# Altium footprint library 我的器件.PCBLIB: 450 footprints (part 5 of 29)
Each footprint in its own frame and in the unit in brackets; x right, y up, seen from the top. Pads: shape width x height; smd on the part's side, far side on the other; paste and mask are expansions set on the pad; w line width, h text height; cw(c..) or ccw(c..) is an arc to the next point about the centre after c.
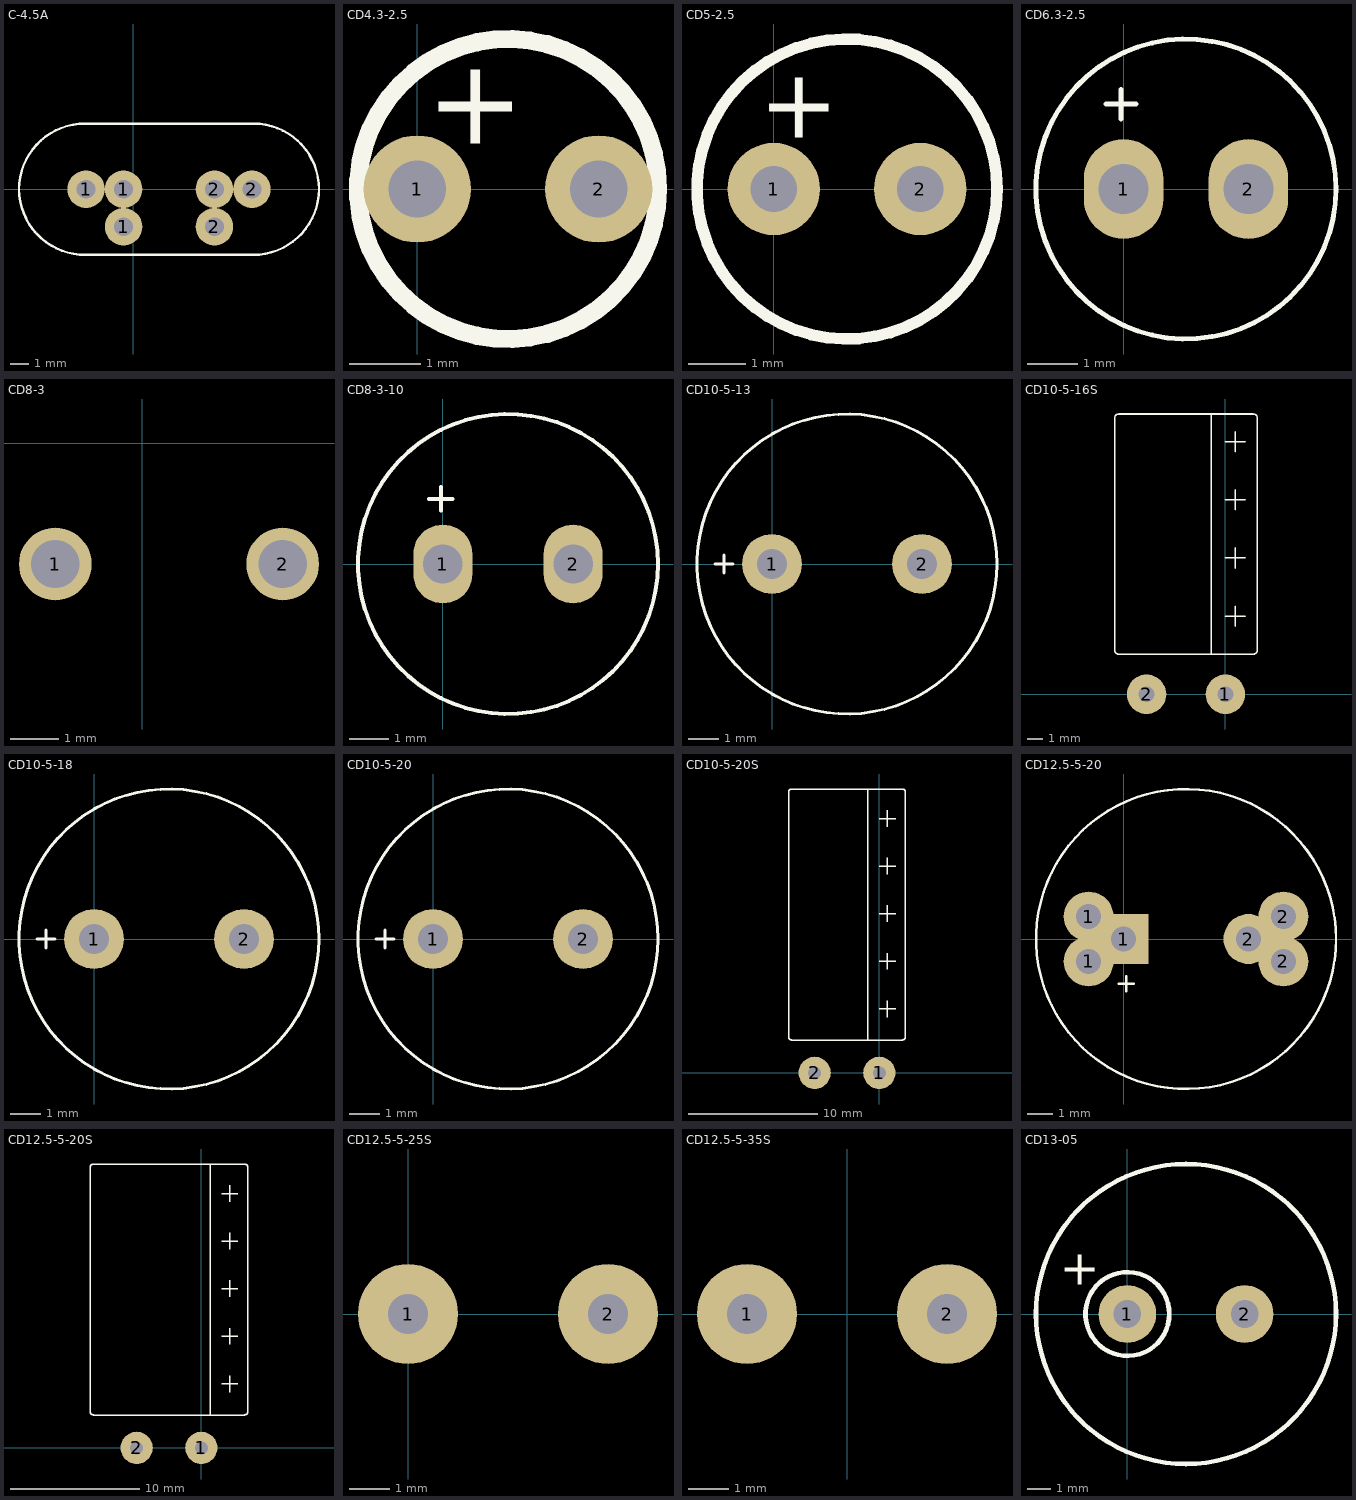
[diagram p4: the footprints below, top view; thin cyan lines are the x and y axes]

## C-4.5A [mm]
pads (6):
  round 2 hole 1: 1(-2.508,0) 1(-0.508,-2) 1(-0.508,0) 2(4.342,-2) 2(4.342,0) 2(6.342,0)
Top Overlay:
  lines w0.127: -6.083,0 cw(c-2.568,-0.015) -2.553,3.5 6.438,3.5 cw(c6.428,0.011) 9.917,0 cw(c6.415,0.002) 6.413,-3.5 -2.528,-3.5 cw(c-2.556,0.027) -6.083,0

## CD4.3-2.5 [mm] "Body 4.0mmX5.0mm"
height 5
pads (2):
  round 1.5 hole 0.8: 1(0,0) 2(2.54,0)
Top Overlay:
  circle w0.254: c1.27,0 r2.1
  text "+" at 0.127,0.635 h1.2

## CD5-2.5 [mm] "Body 5.0mmX12mm"
height 12
pads (2):
  round 1.6 hole 0.8: 1(0,0) 2(2.54,0)
Top Overlay:
  circle w0.2: c1.27,0 r2.6
  text "+" at -0.254,0.889 h1.2

## CD6.3-2.5 [mm] "Body 6.3mmX12mm"
height 12
pads (2):
  oval 1.6x2 hole 1: 1(0,0) 2(2.5,0)
Top Overlay:
  circle w0.1: c1.25,0 r3.008
  lines w0.1: -0.35,1.7 0.25,1.7 ; -0.05,1.4 -0.05,2
3D body: height 1, standoff -2, extent -0.4,-0.399 0.397,0.399
3D body: height 1, standoff -2, extent 2.1,-0.399 2.897,0.399
3D body: height 12.11, standoff 12.1, extent -1.05,-2.295 3.532,2.295
3D body: height 0.1, standoff 0, extent -0.75,-1.996 3.234,1.996
3D body: height 12.1, standoff 0.1, extent -1.95,-3.194 4.425,3.194

## CD8-3 [mm]
pads (2):
  round 1.5 hole 1: 1(-1.8,-2.5) 2(2.9,-2.5)
3D body: height 6.65, standoff -2, extent -2.197,-2.924 -1.401,-2.126
3D body: height 9.9, standoff 3.1, extent -3.399,-0.9 3.399,5.1
3D body: height 9.5, standoff 3.5, extent -2.999,9.4 2.999,11.4
3D body: height 10.49, standoff 2.5, extent -3.998,-0.7 3.998,11.3
3D body: height 6.65, standoff 5.85, extent -2.2,-2.525 -1.402,-0.725
3D body: height 6.65, standoff -2, extent 2.503,-2.899 3.3,-2.101
3D body: height 6.65, standoff 5.85, extent 1.345,-2.782 3.182,-0.945
3D body: height 6.65, standoff 5.85, extent 1.301,-1.5 2.099,0.3

## CD8-3-10 [mm]
pads (2):
  oval 1.5x2 hole 1: 1(0,0) 2(3.3,0)
Top Overlay:
  circle w0.1: c1.65,0 r3.8
  lines w0.1: -0.35,1.65 0.25,1.65 ; -0.05,1.35 -0.05,1.95
3D body: height 11.01, standoff 11, extent -1.347,-2.999 4.65,2.999
3D body: height 11, standoff 0.5, extent -2.45,-4.095 5.75,4.095
3D body: height 1, standoff -2, extent 2.903,-0.399 3.7,0.399
3D body: height 1, standoff -2, extent -0.397,-0.399 0.4,0.399
3D body: height 0.5, standoff 0.49, extent -1.822,-3.493 5.15,3.493
3D body: height 0.5, standoff 0, extent -1.64,-3.525 4.95,-1.25
3D body: height 0.5, standoff 0, extent -1.64,1.25 4.95,3.525

## CD10-5-13 [mm]
pads (2):
  round 2 hole 1: 1(0,0) 2(5,0)
Top Overlay:
  circle w0.1: c2.5,0 r5
  lines w0.1: -1.9,0 -1.3,0 ; -1.6,-0.3 -1.6,0.3
3D body: height 13.01, standoff 13, extent -0.996,-3.499 6,3.499
3D body: height 13, standoff 0.5, extent -2.594,-5.098 7.6,5.099
3D body: height 1, standoff -2, extent 4.603,-0.399 5.4,0.399
3D body: height 1, standoff -2, extent -0.397,-0.399 0.4,0.399
3D body: height 0.5, standoff 0.49, extent -0.972,-3.493 6,3.493
3D body: height 0.5, standoff 0, extent -0.79,-3.525 5.8,-1.25
3D body: height 0.5, standoff 0, extent -0.79,1.25 5.8,3.525

## CD10-5-16S [mm]
pads (2):
  round 2.5 hole 1: 1(0,0) 2(-5,0)
Top Overlay:
  lines w0.1: -0.9,2.54 -0.9,17.754 ; -0.011,4.953 1.259,4.953 ; -0.011,8.636 1.259,8.636 ; -0.011,12.319 1.259,12.319 ; -0.011,16.002 1.259,16.002 ; 0.624,4.318 0.624,5.588 ; 0.624,8.001 0.624,9.271 ; 0.624,11.684 0.624,12.954 ; 0.624,15.367 0.624,16.637 ; -7.021,2.794 ccw(c-6.767,2.794) -6.767,2.54 1.767,2.54 ccw(c1.767,2.794) 2.021,2.794 2.021,17.5 ccw(c1.767,17.5) 1.767,17.754 -6.767,17.754 ccw(c-6.767,17.5) -7.021,17.5 -7.021,2.794
3D body: height 6.65, standoff 5.85, extent -0.4,0.075 0.399,1.875
3D body: height 6.65, standoff -2, extent -0.398,-0.399 0.399,0.399
3D body: height 6.65, standoff 5.85, extent -5.4,0.075 -4.602,1.875
3D body: height 10.36, standoff 0, extent -7.69,2.21 2.69,18.21
3D body: height 8.67, standoff 1.7, extent -5.993,16.225 0.993,18.225
3D body: height 9.17, standoff 1.2, extent -6.49,1.725 1.494,7.725
3D body: height 6.65, standoff -2, extent -5.398,-0.399 -4.601,0.399

## CD10-5-18 [mm] "Body 10mmX18mm Distence 5mm"
pads (2):
  round 2 hole 1: 1(0,0) 2(5,0)
Top Overlay:
  circle w0.1: c2.5,0 r5
  lines w0.1: -1.9,0 -1.3,0 ; -1.6,-0.3 -1.6,0.3
3D body: height 1, standoff -2, extent -0.397,-0.399 0.4,0.399
3D body: height 1, standoff -2, extent 4.603,-0.399 5.4,0.399
3D body: height 18, standoff 0, extent -2.56,-5.09 7.6,5.09
3D body: height 18.01, standoff -0.01, extent -0.972,-3.493 6,3.493

## CD10-5-20 [mm]
pads (2):
  round 2 hole 1: 1(0,0) 2(5,0)
Top Overlay:
  circle w0.1: c2.5,0 r5
  lines w0.1: -1.9,0 -1.3,0 ; -1.6,-0.3 -1.6,0.3
3D body: height 21.01, standoff 21, extent -0.972,-3.493 6,3.493
3D body: height 21, standoff 0.5, extent -2.56,-5.09 7.6,5.09
3D body: height 1, standoff -2, extent 4.603,-0.399 5.4,0.399
3D body: height 1, standoff -2, extent -0.397,-0.399 0.4,0.399
3D body: height 0.5, standoff 0.49, extent -0.972,-3.493 6,3.493
3D body: height 0.5, standoff 0, extent -0.79,-3.525 5.8,-1.25
3D body: height 0.5, standoff 0, extent -0.79,1.25 5.8,3.525

## CD10-5-20S [mm]
pads (2):
  round 2.5 hole 1: 1(0,0) 2(-5,0)
Top Overlay:
  lines w0.1: -0.9,2.54 -0.9,21.971 ; -0.011,4.953 1.259,4.953 ; -0.011,8.636 1.259,8.636 ; -0.011,12.319 1.259,12.319 ; -0.011,16.002 1.259,16.002 ; -0.011,19.685 1.259,19.685 ; 0.624,4.318 0.624,5.588 ; 0.624,8.001 0.624,9.271 ; 0.624,11.684 0.624,12.954 ; 0.624,15.367 0.624,16.637 ; 0.624,19.05 0.624,20.32 ; -7.021,2.794 ccw(c-6.767,2.794) -6.767,2.54 1.767,2.54 ccw(c1.767,2.794) 2.021,2.794 2.021,21.717 ccw(c1.767,21.717) 1.767,21.971 -6.767,21.971 ccw(c-6.767,21.717) -7.021,21.717 -7.021,2.794
3D body: height 6.65, standoff -2, extent -5.398,-0.399 -4.601,0.399
3D body: height 9.17, standoff 1.2, extent -6.49,1.725 1.494,7.725
3D body: height 8.67, standoff 1.7, extent -5.993,20.225 0.993,22.225
3D body: height 10.36, standoff 0, extent -7.69,2.21 2.69,22.21
3D body: height 6.65, standoff 5.85, extent -5.4,0.075 -4.602,1.875
3D body: height 6.65, standoff -2, extent -0.398,-0.399 0.399,0.399
3D body: height 6.65, standoff 5.85, extent -0.4,0.075 0.399,1.875

## CD12.5-5-20 [mm]
pads (6):
  round 2 hole 1: 1(-1.4,-0.9) 1(-1.4,0.9) 2(5,0) 2(6.4,-0.9) 2(6.4,0.9)
  rect 2x2 hole 1: 1(0,0)
Top Overlay:
  circle w0.1: c2.5,0 r6.007
  lines w0.1: -0.2,-1.8 0.4,-1.8 ; 0.1,-2.1 0.1,-1.5
3D body: height 0.5, standoff 0, extent -1.4,1 6.375,4
3D body: height 0.5, standoff 0, extent -1.375,-4 6.4,-1
3D body: height 0.5, standoff 0.49, extent -1.492,-3.968 6.492,4
3D body: height 1, standoff -2, extent 4.603,-0.399 5.4,0.399
3D body: height 1, standoff -2, extent -0.397,-0.399 0.4,0.399
3D body: height 21.01, standoff 21, extent -1.468,-3.992 6.5,3.992
3D body: height 21, standoff 0.5, extent -3.8,-6.337 8.85,6.338

## CD12.5-5-20S [mm]
pads (2):
  round 2.5 hole 1: 1(0,0) 2(-5,0)
Top Overlay:
  lines w0.1: 0.675,2.54 0.675,21.971 ; 1.564,4.953 2.834,4.953 ; 1.564,8.636 2.834,8.636 ; 1.564,12.319 2.834,12.319 ; 1.564,16.002 2.834,16.002 ; 1.564,19.685 2.834,19.685 ; 2.199,4.318 2.199,5.588 ; 2.199,8.001 2.199,9.271 ; 2.199,11.684 2.199,12.954 ; 2.199,15.367 2.199,16.637 ; 2.199,19.05 2.199,20.32 ; -8.596,2.794 ccw(c-8.342,2.794) -8.342,2.54 3.342,2.54 ccw(c3.342,2.794) 3.596,2.794 3.596,21.717 ccw(c3.342,21.717) 3.342,21.971 -8.342,21.971 ccw(c-8.342,21.717) -8.596,21.717 -8.596,2.794
3D body: height 6.65, standoff -2, extent -5.398,-0.399 -4.601,0.399
3D body: height 10.37, standoff 2.4, extent -6.49,1.725 1.494,7.725
3D body: height 10.37, standoff 2.4, extent -6.492,20.225 1.492,22.225
3D body: height 12.75, standoff 0, extent -8.887,2.21 3.887,22.21
3D body: height 6.65, standoff 5.85, extent -5.4,0.075 -4.602,1.875
3D body: height 6.65, standoff -2, extent -0.398,-0.399 0.399,0.399
3D body: height 6.65, standoff 5.85, extent -0.4,0.075 0.399,1.875

## CD12.5-5-25S [mm]
pads (2):
  round 2.5 hole 1: 1(0,0) 2(5,0)
3D body: height 6.65, standoff 5.85, extent 4.6,0.075 5.399,1.875
3D body: height 6.65, standoff -2, extent 4.602,-0.399 5.399,0.399
3D body: height 6.65, standoff 5.85, extent -0.4,0.075 0.398,1.875
3D body: height 12.45, standoff 0, extent -3.734,1.925 8.741,26.925
3D body: height 10.22, standoff 2.25, extent -1.492,24.975 6.492,26.975
3D body: height 10.22, standoff 2.25, extent -1.49,1.725 6.494,7.725
3D body: height 6.65, standoff -2, extent -0.398,-0.399 0.399,0.399

## CD12.5-5-35S [mm]
pads (2):
  round 2.5 hole 1: 1(-2.5,0) 2(2.5,0)
3D body: height 6.65, standoff -2, extent -2.898,-0.399 -2.101,0.399
3D body: height 10.22, standoff 2.25, extent -3.99,1.725 3.994,7.725
3D body: height 10.22, standoff 2.25, extent -3.992,34.9 3.992,36.9
3D body: height 12.48, standoff 0, extent -6.245,1.8 6.245,36.8
3D body: height 6.65, standoff 5.85, extent -2.9,0.075 -2.102,1.875
3D body: height 6.65, standoff -2, extent 2.102,-0.399 2.899,0.399
3D body: height 6.65, standoff 5.85, extent 2.1,0.075 2.899,1.875

## CD13-05 [mm]
height 26
pads (2):
  round 2.5 hole 1.2: 1(0,0) 2(5.08,0)
Top Overlay:
  circle w0.2: c0,0 r1.818
  circle w0.2: c2.54,0 r6.5
  text "+" at -2.921,1.27 h1.52